# Altium footprint library hallglib.PcbLib: 92 footprints (part 4 of 6)
Each footprint in its own frame and in the unit in brackets; x right, y up, seen from the top. Pads: shape width x height; smd on the part's side, far side on the other; paste and mask are expansions set on the pad; w line width, h text height; cw(c..) or ccw(c..) is an arc to the next point about the centre after c.
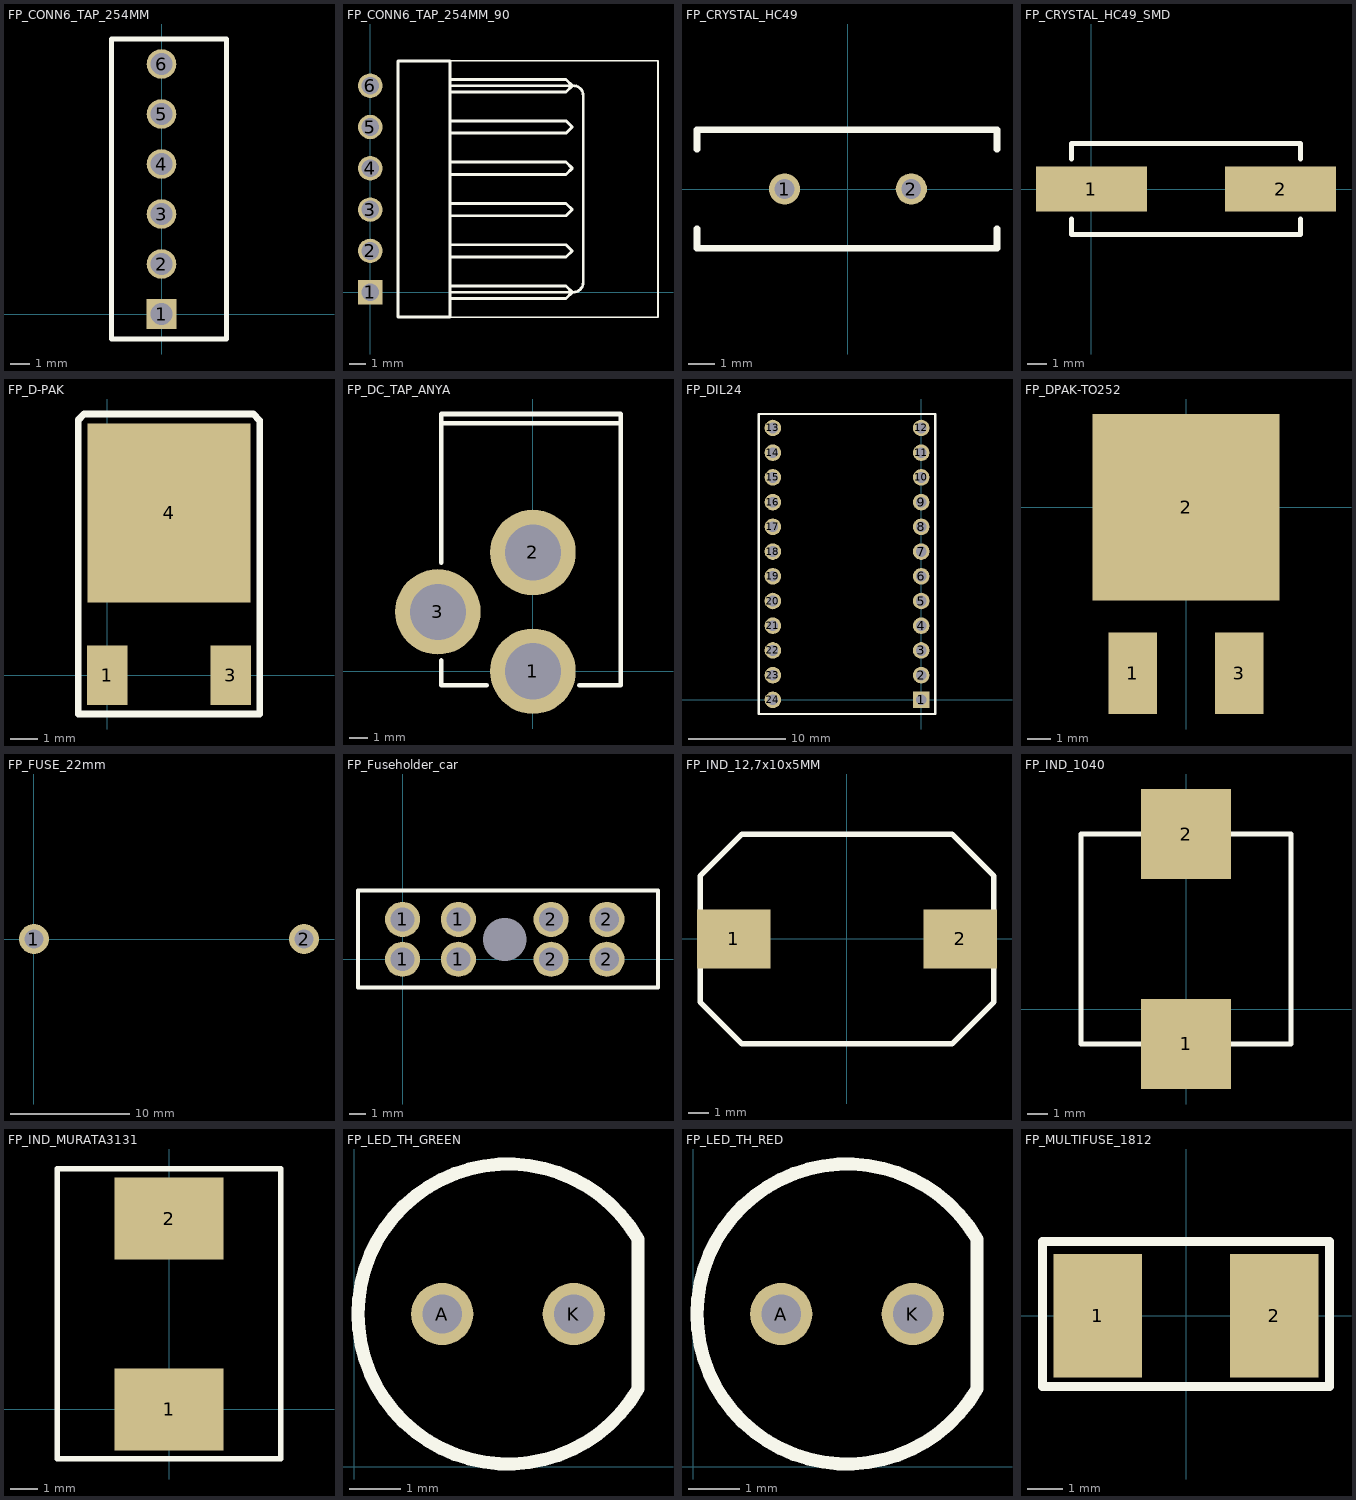
[diagram p3: the footprints below, top view; thin cyan lines are the x and y axes]

## FP_CONN6_TAP_254MM [mm] "álló hat pólusú tápcsatlakozó 2.54mm"
height 6.3
pads (6):
  rect 1.5x1.5 hole 1.1: 1(0,0)
  round 1.5 hole 1.1: 2(0,2.54) 3(0,5.08) 4(0,7.62) 5(0,10.16) 6(0,12.7)
Top Overlay:
  lines w0.254: -2.54,-1.27 -2.54,13.97 3.302,13.97 3.302,-1.27 -2.54,-1.27
3D body "Cvilux_CI31_6.step": height 11.56, standoff -3.24, extent -2.521,-1.27 3.279,13.97

## FP_CONN6_TAP_254MM_90 [mm] "fekvő hat pólusú tápcsatlakozó 2.54mm"
height 6.3
pads (6):
  rect 1.5x1.5 hole 1.1: 1(0,0)
  round 1.5 hole 1.1: 2(0,2.54) 3(0,5.08) 4(0,7.62) 5(0,10.16) 6(0,12.7)
Top Overlay:
  lines w0.102: 4.9,-1.53 17.7,-1.53 17.7,14.224 4.9,14.224
  lines w0.178: 4.9,0 12.5,0 ccw(c12.5,0.6) 13.1,0.6 13.1,12.065 ; 4.9,12.7 12.5,12.7 cw(c12.5,12.1) 13.1,12.1 ; 4.934,-0.381 12.046,-0.381 12.427,0 12.046,0.381 4.934,0.381 ; 4.934,2.159 12.046,2.159 12.427,2.54 12.046,2.921 4.934,2.921 ; 4.934,4.699 12.046,4.699 12.427,5.08 12.046,5.461 4.934,5.461 ; 4.934,7.239 12.046,7.239 12.427,7.62 12.046,8.001 4.934,8.001 ; 4.934,9.779 12.046,9.779 12.427,10.16 12.046,10.541 4.934,10.541 ; 4.934,12.319 12.046,12.319 12.427,12.7 12.046,13.081 4.934,13.081 ; 1.7,-1.524 4.9,-1.524 4.9,14.224 1.7,14.224 1.7,-1.524
3D body "254_TAP_4P.STEP": height 5.8, standoff -3.4, extent -0.343,-1.295 13.482,8.865
3D body "254_TAP_4P.STEP": height 5.8, standoff -3.4, extent -0.343,3.785 13.482,13.945

## FP_CRYSTAL_HC49 [mm] "HC49"
height 3.7
pads (2):
  round 1.2 hole 0.762: 1(-2.44,0) 2(2.44,0)
Top Overlay:
  lines w0.254: -5.816,-1.524 -5.816,-2.286 5.741,-2.286 5.741,-1.524 ; -5.816,1.524 -5.816,2.286 5.741,2.286 5.741,1.524
3D body "SW3dPS-HP49US.STEP": height 3.5, standoff -4, extent -5.675,-2.35 5.675,2.3

## FP_CRYSTAL_HC49_SMD [mil] "HC49/SMD"
height 118.11
pads (2):
  rect 220x90 smd: 1(0,0) 2(375,0)
Top Overlay:
  lines w10: -40,-60 -40,-90 415,-90 415,-60 ; -40,60 -40,90 415,90 415,60
3D body: height 130, standoff 10, extent -25,-80 400,80
3D body: height 10, standoff 0, extent -40,-90 415,90
3D body: height 5, standoff 0, extent -57,-20 -40,20
3D body: height 5, standoff 0, extent 415,-20 432,20

## FP_D-PAK [mm] "D-Pak (TO-252-AA)"
height 2.39
pads (3):
  rect 1.5x2.2 smd: 1(0,0) 3(4.572,0)
  rect 6x6.6 smd: 4(2.286,6)
Top Overlay:
  lines w0.254: -1.064,-1.425 -1.064,9.436 -0.85,9.65 5.4,9.65 5.636,9.414 5.636,-1.425 -1.064,-1.425
3D body "D-PAK_TO252AA.STEP": height 2.32, standoff 0.02, extent -0.992,-0.786 5.588,8.914

## FP_DC_TAP_ANYA [mil] "DC HEBA25 TÁPFESZÜLTSÉG ALJZAT ZÁRT, NYÁKBA 90°"
height 421.26
pads (3):
  round 180 hole 118: 1(0,0) 2(0,250) 3(-200,125)
Top Overlay:
  lines w10: -192.91,22.64 -192.91,-29.53 -97.44,-29.53 ; -192.91,228.35 -192.91,541.34 185.04,541.34 185.04,-29.53 97.44,-29.53 ; -192.91,522.13 185.04,522.13
3D body "kycon kld-0202-a.step": height 440, standoff -141.73, extent -190.39,-30.63 182.52,539.37

## FP_DIL24 [mm] "DIL24"
height 8.54
pads (24):
  rect 1.7x1.7 hole 1.1: 1(0,0)
  round 1.7 hole 1.1: 2(0,2.54) 3(0,5.08) 4(0,7.62) 5(0,10.16) 6(0,12.7) 7(0,15.24) 8(0,17.78) 9(0,20.32) 10(0,22.86) 11(0,25.4) 12(0,27.94) 13(-15.24,27.94) 14(-15.24,25.4) 15(-15.24,22.86) 16(-15.24,20.32) 17(-15.24,17.78) 18(-15.24,15.24) 19(-15.24,12.7) 20(-15.24,10.16) 21(-15.24,7.62) 22(-15.24,5.08) 23(-15.24,2.54) 24(-15.24,0)
Top Overlay:
  lines w0.254: -16.7,-1.45 -16.7,29.375 1.45,29.375 1.45,-1.45 -16.7,-1.45
3D body: height 4.86, standoff 4, extent -9.125,4.25 -6.125,6.75
3D body: height 4, standoff 2.54, extent -16.525,-1.275 1.275,29.2
3D body: height 2.54, standoff 0, extent -1.27,3.81 1.27,8.89
3D body: height 0, standoff -3, extent -0.33,4.75 0.33,5.41
3D body: height 0, standoff -3, extent -0.33,7.29 0.33,7.95
3D body: height 0, standoff -3, extent -0.33,2.21 0.33,2.87
3D body: height 0, standoff -3, extent -0.33,-0.33 0.33,0.33
3D body: height 2.54, standoff 0, extent -1.27,-1.27 1.27,3.81
3D body: height 0, standoff -3, extent -0.33,12.385 0.33,13.045
3D body: height 0, standoff -3, extent -0.33,9.845 0.33,10.505
3D body: height 2.54, standoff 0, extent -1.27,8.905 1.27,13.985
3D body: height 0, standoff -3, extent -0.33,17.46 0.33,18.12
3D body: height 0, standoff -3, extent -0.33,14.92 0.33,15.58
3D body: height 2.54, standoff 0, extent -1.27,13.98 1.27,19.06
3D body: height 0, standoff -3, extent -0.33,22.535 0.33,23.195
3D body: height 0, standoff -3, extent -0.33,19.995 0.33,20.655
3D body: height 2.54, standoff 0, extent -1.27,19.055 1.27,24.135
3D body: height 0, standoff -3, extent -0.33,27.61 0.33,28.27
3D body: height 0, standoff -3, extent -0.33,25.07 0.33,25.73
3D body: height 2.54, standoff 0, extent -1.27,24.13 1.27,29.21
3D body: height 2.54, standoff 0, extent -16.52,24.13 -13.98,29.21
3D body: height 0, standoff -3, extent -15.58,25.07 -14.92,25.73
3D body: height 0, standoff -3, extent -15.58,27.61 -14.92,28.27
3D body: height 2.54, standoff 0, extent -16.52,19.055 -13.98,24.135
3D body: height 0, standoff -3, extent -15.58,19.995 -14.92,20.655
3D body: height 0, standoff -3, extent -15.58,22.535 -14.92,23.195
3D body: height 2.54, standoff 0, extent -16.52,13.98 -13.98,19.06
3D body: height 0, standoff -3, extent -15.58,14.92 -14.92,15.58
3D body: height 0, standoff -3, extent -15.58,17.46 -14.92,18.12
3D body: height 2.54, standoff 0, extent -16.52,8.905 -13.98,13.985
3D body: height 0, standoff -3, extent -15.58,9.845 -14.92,10.505
3D body: height 0, standoff -3, extent -15.58,12.385 -14.92,13.045
3D body: height 2.54, standoff 0, extent -16.52,-1.27 -13.98,3.81
3D body: height 0, standoff -3, extent -15.58,-0.33 -14.92,0.33
3D body: height 0, standoff -3, extent -15.58,2.21 -14.92,2.87
3D body: height 0, standoff -3, extent -15.58,7.29 -14.92,7.95
3D body: height 0, standoff -3, extent -15.58,4.75 -14.92,5.41
3D body: height 2.54, standoff 0, extent -16.52,3.81 -13.98,8.89

## FP_DPAK-TO252 [mm] "D-PAK Package"
height 2.18
pads (3):
  rect 2.08x3.5 smd: 1(-2.286,-7.112) 3(2.286,-7.112)
  rect 8x8 smd: 2(0,0)
3D body "DPAK_TO-252AA.STEP": height 2.37, standoff -0.03, extent -3.367,-7.112 3.367,2.988

## FP_FUSE_22mm [mm]
pads (2):
  round 2.5 hole 1.6: 1(0,0) 2(22.6,0)
3D body "User Library-Fuse_Holder.STEP": height 13.44, standoff -5.4, extent -0.253,-4.5 22.907,4.5

## FP_Fuseholder_car [mm]
pads (9):
  round 2.2 hole 1.5: 1(0,0) 1(0,2.5) 1(3.5,0) 1(3.5,2.5) 2(9.3,0) 2(9.3,2.5) 2(12.8,0) 2(12.8,2.5)
  round 0 hole 2.7 unplated: ""(6.4,1.25)
Top Overlay:
  lines w0.254: -2.794,-1.778 -2.794,4.318 16.002,4.318 16.002,-1.778 -2.794,-1.778
3D body: height 16, standoff 0, extent -2.794,-1.778 16.002,4.318
3D body "User Library-ATO-ATC STANDARD BLADE FUSE.step": height 26.29, standoff 7.49, extent -2.794,-1.27 16.256,3.81
3D body: height 2, standoff -4, extent -0.694,1.802 0.7,3.199
3D body: height 2, standoff -4, extent 2.806,1.802 4.2,3.199
3D body: height 2, standoff -4, extent 2.806,-0.698 4.2,0.699
3D body: height 2, standoff -4, extent -0.694,-0.698 0.7,0.699
3D body: height 2, standoff -4, extent 8.606,1.802 10,3.199
3D body: height 2, standoff -4, extent 8.606,-0.698 10,0.699
3D body: height 2, standoff -4, extent 12.106,1.802 13.5,3.199
3D body: height 2, standoff -4, extent 12.106,-0.698 13.5,0.699
3D body: height 0, standoff -6, extent 5.21,0.053 7.6,2.448

## FP_IND_12,7x10x5MM [mm] "Induktivitás"
height 5
pads (2):
  rect 3.5x2.8 smd: 1(-5.4,0) 2(5.4,0)
Top Overlay:
  lines w0.254: -4,-5 -5,-5 -7,-3 -7,-1.6 -7,1.6 -7,3 -5,5 -4,5 ; -4,-5 -4,-5 ; -4,-5 4,-5 ; -4,5 -4,5 ; -4,5 4,5 ; 4,-5 5,-5 7,-3 7,-1.6 7,1.6 7,3 5,5 4,5 ; 4,-5 4,-5 ; 4,5 4,5
3D body: height 5, standoff 4.5, extent -4.216,-4.241 4.25,4.242
3D body: height 1, standoff 0, extent -6.35,-5.08 6.35,5.08
3D body: height 4.5, standoff 1, extent -3.671,-3.693 3.7,3.693

## FP_IND_1040 [mm] "Murata Chip Inductor LQH88P Series (3131 Size)"
height 4
pads (2):
  rect 4.5x4.5 smd: 1(0,-1.75) 2(0,8.75)
Top Overlay:
  lines w0.254: -5.25,-1.75 -5.25,8.75 5.25,8.75 5.25,-1.75 -5.25,-1.75
3D body: height 4, standoff 0, extent -5.25,-1.75 5.25,8.75
3D body: height 0.3, standoff 0, extent -1.4,-0.55 1.4,-0.5
3D body: height 0.3, standoff 0, extent -1.4,7.6 1.4,7.65

## FP_IND_MURATA3131 [mm] "Murata Chip Inductor LQH88P Series (3131 Size)"
height 4
pads (2):
  rect 4x3 smd: 1(0,0) 2(0,7)
Top Overlay:
  lines w0.2: -4.1,-1.8 4.1,-1.8 4.1,8.825 -4.1,8.825 -4.1,-1.8
3D body: height 0.3, standoff 0, extent -1.4,7.6 1.4,7.65
3D body: height 0.3, standoff 0, extent -1.4,-0.55 1.4,-0.5
3D body: height 2.8, standoff 1, extent -3.572,-0.043 3.6,7.143
3D body: height 3.8, standoff 2.8, extent -4,-0.5 4,7.6
3D body: height 1, standoff 0, extent -4,-0.5 4,7.6

## FP_LED_TH_GREEN [mm]
pads (2):
  round 1.2 hole 0.762: A(1.7,2.95) K(4.24,2.95)
Top Overlay:
  lines w0.254: 5.478,1.502 cw(c2.97,2.95) 5.478,4.398 5.478,1.502
3D body "corto_green.step": height 10.25, standoff -5, extent 0,0 5.45,5.9

## FP_LED_TH_RED [mm]
pads (2):
  round 1.2 hole 0.762: A(1.7,2.95) K(4.24,2.95)
Top Overlay:
  lines w0.254: 5.478,1.502 cw(c2.97,2.95) 5.478,4.398 5.478,1.502
3D body "corto_red.step": height 10.25, standoff -5, extent 0,0 5.45,5.9

## FP_MULTIFUSE_1812 [mm]
pads (2):
  rect 2.5x3.5 smd: 1(-2.5,0) 2(2.5,0)
Top Overlay:
  lines w0.254: -4.064,-2 4.064,-2 4.064,0.464 4.064,2.1 -4.064,2.1 -4.064,-2
3D body "fuse.STEP": height 1.34, standoff 0, extent -2.365,-1.705 2.365,1.705